# Altium footprint library ICs And Semiconductors THD.PcbLib: 507 footprints (part 13 of 32) (continued)
## GVA_IPSS-DU [mm] "Decoupling Unit (DU) Using Toroidal-Core Transformer, Body 49.5mm x 49.5mm"
height 27
pads (11):
  round 1.7 hole 1: +1(14.87,-20) +2(17.41,-20) +3(19.95,-20) -1(-20.05,-20) -2(-17.51,-20) -3(-14.97,-20) NC1(-20.05,20) NC2(-17.51,20) NC3(17.41,20) NC4(19.95,20)
  round 1 hole 40 unplated mask+19.5: MECH(0,0)
Top Overlay:
  lines w0.2: -18.51,-22.9 -17.51,-22.9 -16.51,-22.9 ; 16.41,-22.9 17.41,-22.9 ; 17.41,-23.9 17.41,-22.9 ; 17.41,-21.9 17.41,-22.9 ; 18.41,-22.9 17.41,-22.9 ; -24.75,-20.75 ccw(c-20.75,-20.75) -20.75,-24.75 20.75,-24.75 ccw(c20.75,-20.75) 24.75,-20.75 24.75,20.75 ccw(c20.75,20.75) 20.75,24.75 -20.75,24.75 ccw(c-20.75,20.75) -24.75,20.75 -24.75,-20.75
Notvisible:
  lines w0.1: -20.55,-20 -20.05,-20 ; -20.55,20 -20.05,20 ; -20.05,-20.5 -20.05,-20 ; -20.05,-19.5 -20.05,-20 ; -20.05,19.5 -20.05,20 ; -20.05,20.5 -20.05,20 ; -19.55,-20 -20.05,-20 ; -19.55,20 -20.05,20 ; -18.01,-20 -17.51,-20 ; -18.01,20 -17.51,20 ; -17.51,-20.5 -17.51,-20 ; -17.51,-19.5 -17.51,-20 ; -17.51,19.5 -17.51,20 ; -17.51,20.5 -17.51,20 ; -17.01,-20 -17.51,-20 ; -17.01,20 -17.51,20 ; -15.47,-20 -14.97,-20 ; -14.97,-20.5 -14.97,-20 ; -14.97,-19.5 -14.97,-20 ; -14.47,-20 -14.97,-20 ; -0.5,0 0,0 ; 0,-0.5 0,0 ; 0,0.5 0,0 ; 0.5,0 0,0 ; 14.37,-20 14.87,-20 ; 14.87,-20.5 14.87,-20 ; 14.87,-19.5 14.87,-20 ; 15.37,-20 14.87,-20 ; 16.91,-20 17.41,-20 ; 16.91,20 17.41,20 ; 17.41,-20.5 17.41,-20 ; 17.41,-19.5 17.41,-20 ; 17.41,19.5 17.41,20 ; 17.41,20.5 17.41,20 ; 17.91,-20 17.41,-20 ; 17.91,20 17.41,20 ; 19.45,-20 19.95,-20 ; 19.45,20 19.95,20 ; 19.95,-20.5 19.95,-20 ; 19.95,-19.5 19.95,-20 ; 19.95,19.5 19.95,20 ; 19.95,20.5 19.95,20 ; 20.45,-20 19.95,-20 ; 20.45,20 19.95,20
Mechanical 14:
  circle w0.1: c0,0 r9.9
  circle w0.1: c0,0 r5
  lines w0.1: -18.51,-22.9 -17.51,-22.9 -16.51,-22.9 ; 16.41,-22.9 17.41,-22.9 ; 17.41,-23.9 17.41,-22.9 ; 17.41,-21.9 17.41,-22.9 ; 18.41,-22.9 17.41,-22.9 ; -24.75,-20.75 ccw(c-20.75,-20.75) -20.75,-24.75 20.75,-24.75 ccw(c20.75,-20.75) 24.75,-20.75 24.75,20.75 ccw(c20.75,20.75) 20.75,24.75 -20.75,24.75 ccw(c-20.75,20.75) -24.75,20.75 -24.75,-20.75
3D body "GVA_IPSS-DU.stp": height 27, standoff -3.8, extent -24.75,-24.75 24.75,24.75

## HAMAMATSU_H7546B [mm] "MAPMT 8×8 Multianode, High Speed Response, Low Cross-talk, 30 mm2, Body 30.5 x 30.5 x 47.6mm"
height 47.6
pads (73):
  round 1.6 hole 0.9: 1(8.89,8.89) 2(8.89,6.35) 3(8.89,3.81) 4(8.89,1.27) 5(8.89,-1.27) 6(8.89,-3.81) 7(8.89,-6.35) 8(8.89,-8.89) 9(6.35,8.89) 10(6.35,6.35) 11(6.35,3.81) 12(6.35,1.27) 13(6.35,-1.27) 14(6.35,-3.81) 15(6.35,-6.35) 16(6.35,-8.89) 17(3.81,8.89) 18(3.81,6.35) 19(3.81,3.81) 20(3.81,1.27) 21(3.81,-1.27) 22(3.81,-3.81) 23(3.81,-6.35) 24(3.81,-8.89) 25(1.27,8.89) 26(1.27,6.35) 27(1.27,3.81) 28(1.27,1.27) 29(1.27,-1.27) 30(1.27,-3.81) 31(1.27,-6.35) 32(1.27,-8.89) 33(-1.27,8.89) 34(-1.27,6.35) 35(-1.27,3.81) 36(-1.27,1.27) 37(-1.27,-1.27) 38(-1.27,-3.81) 39(-1.27,-6.35) 40(-1.27,-8.89) 41(-3.81,8.89) 42(-3.81,6.35) 43(-3.81,3.81) 44(-3.81,1.27) 45(-3.81,-1.27) 46(-3.81,-3.81) 47(-3.81,-6.35) 48(-3.81,-8.89) 49(-6.35,8.89) 50(-6.35,6.35) 51(-6.35,3.81) 52(-6.35,1.27) 53(-6.35,-1.27) 54(-6.35,-3.81) 55(-6.35,-6.35) 56(-6.35,-8.89) 57(-8.89,8.89) 58(-8.89,6.35) 59(-8.89,3.81) 60(-8.89,1.27) 61(-8.89,-1.27) 62(-8.89,-3.81) 63(-8.89,-6.35) 64(-8.89,-8.89)
  round 1.6 hole 0.9 paste+0: 65(11.43,6.35) 66(11.43,3.81) 67(11.43,1.27) 68(-11.43,6.35) 69(-11.43,-6.35)
  round 1 hole 5 unplated mask+2: MEC(-11.43,-11.43) MEC(-11.43,11.43) MEC(11.43,-11.43) MEC(11.43,11.43)
Top Overlay:
  lines w0.2: -14.25,-10.43 -14.25,10.43 ; -12.85,-8.372 -12.85,8.372 ; -10.43,-14.25 10.43,-14.25 ; -10.43,14.25 10.43,14.25 ; -8.372,-12.85 8.372,-12.85 ; -8.372,12.85 8.372,12.85 ; 12.85,-8.372 12.85,8.372 ; 14.25,-10.43 14.25,10.43 ; -15.25,-15.25 -15.25,15.25 15.25,15.25 15.25,-15.25 -15.25,-15.25
  text "57" at -8,10.33 h1.2
  text "64" at -8,-11.6 h1.2
  text "8" at 7.05,-11.5 h1.2
  text "1" at 6.85,10.33 h1.2
Notvisible:
  drawing of 300 lines, arcs and shapes, not listed
Mechanical 14:
  drawing of 276 lines, arcs and shapes, not listed
  text "57" at -8,10.33 h1.2
  text "64" at -8,-11.6 h1.2
  text "8" at 7.05,-11.5 h1.2
  text "1" at 6.85,10.33 h1.2
3D body "HAMAMATSU_H7546B_part1.stp": height 47.6, standoff -3.6, extent -15.25,-15.25 15.25,15.25
3D body "HAMAMATSU_H7546B_part2.stp": height 46.8, standoff 46.3, extent -11.85,-11.85 11.85,11.85

## HAMAMATSU_S11105 [mm] "22 Leads Dual In-Line Package, Row Spacing 10.16mm; Pitch 2.54mm"
height 4
pads (22):
  rect 1.6x1.6 hole 0.9: 1(-5.08,12.7)
  round 1.6 hole 0.9: 2(-5.08,10.16) 3(-5.08,7.62) 4(-5.08,5.08) 5(-5.08,2.54) 6(-5.08,0) 7(-5.08,-2.54) 8(-5.08,-5.08) 9(-5.08,-7.62) 10(-5.08,-10.16) 11(-5.08,-12.7) 12(5.08,-12.7) 13(5.08,-10.16) 14(5.08,-7.62) 15(5.08,-5.08) 16(5.08,-2.54) 17(5.08,0) 18(5.08,2.54) 19(5.08,5.08) 20(5.08,7.62) 21(5.08,10.16) 22(5.08,12.7)
Top Overlay:
  lines w0.2: -5,-13.797 -5,-15.875 5,-15.875 5,-13.797 ; -5,13.797 -5,15.875 5,15.875 5,13.797 ; -4.046,-7.995 ccw(c-4,-7.8) -4,-8 4,-8 ccw(c4,-7.8) 4.046,-7.995 ; -4.046,7.995 cw(c-4,7.8) -4,8 4,8 cw(c4,7.8) 4.046,7.995 ; -3.55,13.2 -1.95,14.8 -3.55,14.8 -3.55,13.2 ; -3,-5.3 ccw(c-2.8,-5.3) -2.8,-5.5 2.8,-5.5 ccw(c2.8,-5.3) 3,-5.3 3,5.3 ccw(c2.8,5.3) 2.8,5.5 -2.8,5.5 ccw(c-2.8,5.3) -3,5.3 -3,-5.3 ; -2.5,-4.3 ccw(c-2.3,-4.3) -2.3,-4.5 2,-4.5 ccw(c2,-4.3) 2.2,-4.3 2.2,4.3 ccw(c2,4.3) 2,4.5 -2.3,4.5 ccw(c-2.3,4.3) -2.5,4.3 -2.5,-4.3 ; -1.05,-4 1.75,-4 1.75,4 -1.05,4 -1.05,-4 ; -0.25,-2.8 0.25,-2.8 0.25,3.6 -0.25,3.6 -0.25,-2.8
Notvisible:
  lines w0.1: -5.58,-12.7 -5.08,-12.7 ; -5.58,-10.16 -5.08,-10.16 ; -5.58,-7.62 -5.08,-7.62 ; -5.58,-5.08 -5.08,-5.08 ; -5.58,-2.54 -5.08,-2.54 ; -5.58,0 -5.08,0 ; -5.58,2.54 -5.08,2.54 ; -5.58,5.08 -5.08,5.08 ; -5.58,7.62 -5.08,7.62 ; -5.58,10.16 -5.08,10.16 ; -5.58,12.7 -5.08,12.7 ; -5.08,-13.2 -5.08,-12.7 ; -5.08,-12.2 -5.08,-12.7 ; -5.08,-10.66 -5.08,-10.16 ; -5.08,-9.66 -5.08,-10.16 ; -5.08,-8.12 -5.08,-7.62 ; -5.08,-7.12 -5.08,-7.62 ; -5.08,-5.58 -5.08,-5.08 ; -5.08,-4.58 -5.08,-5.08 ; -5.08,-3.04 -5.08,-2.54 ; -5.08,-2.04 -5.08,-2.54 ; -5.08,-0.5 -5.08,0 ; -5.08,0.5 -5.08,0 ; -5.08,2.04 -5.08,2.54 ; -5.08,3.04 -5.08,2.54 ; -5.08,4.58 -5.08,5.08 ; -5.08,5.58 -5.08,5.08 ; -5.08,7.12 -5.08,7.62 ; -5.08,8.12 -5.08,7.62 ; -5.08,9.66 -5.08,10.16 ; -5.08,10.66 -5.08,10.16 ; -5.08,12.2 -5.08,12.7 ; -5.08,13.2 -5.08,12.7 ; -4.58,-12.7 -5.08,-12.7 ; -4.58,-10.16 -5.08,-10.16 ; -4.58,-7.62 -5.08,-7.62 ; -4.58,-5.08 -5.08,-5.08 ; -4.58,-2.54 -5.08,-2.54 ; -4.58,0 -5.08,0 ; -4.58,2.54 -5.08,2.54 ; -4.58,5.08 -5.08,5.08 ; -4.58,7.62 -5.08,7.62 ; -4.58,10.16 -5.08,10.16 ; -4.58,12.7 -5.08,12.7 ; -0.5,0 0,0 ; 0,-0.5 0,0 ; 0,0.5 0,0 ; 0.5,0 0,0 ; 4.58,-12.7 5.08,-12.7 ; 4.58,-10.16 5.08,-10.16 ; 4.58,-7.62 5.08,-7.62 ; 4.58,-5.08 5.08,-5.08 ; 4.58,-2.54 5.08,-2.54 ; 4.58,0 5.08,0 ; 4.58,2.54 5.08,2.54 ; 4.58,5.08 5.08,5.08 ; 4.58,7.62 5.08,7.62 ; 4.58,10.16 5.08,10.16 ; 4.58,12.7 5.08,12.7 ; 5.08,-13.2 5.08,-12.7 ; 5.08,-12.2 5.08,-12.7 ; 5.08,-10.66 5.08,-10.16 ; 5.08,-9.66 5.08,-10.16 ; 5.08,-8.12 5.08,-7.62 ; 5.08,-7.12 5.08,-7.62 ; 5.08,-5.58 5.08,-5.08 ; 5.08,-4.58 5.08,-5.08 ; 5.08,-3.04 5.08,-2.54 ; 5.08,-2.04 5.08,-2.54 ; 5.08,-0.5 5.08,0 ; 5.08,0.5 5.08,0 ; 5.08,2.04 5.08,2.54 ; 5.08,3.04 5.08,2.54 ; 5.08,4.58 5.08,5.08 ; 5.08,5.58 5.08,5.08 ; 5.08,7.12 5.08,7.62 ; 5.08,8.12 5.08,7.62 ; 5.08,9.66 5.08,10.16 ; 5.08,10.66 5.08,10.16 ; 5.08,12.2 5.08,12.7 ; 5.08,13.2 5.08,12.7 ; 5.58,-12.7 5.08,-12.7 ; 5.58,-10.16 5.08,-10.16 ; 5.58,-7.62 5.08,-7.62 ; 5.58,-5.08 5.08,-5.08 ; 5.58,-2.54 5.08,-2.54 ; 5.58,0 5.08,0 ; 5.58,2.54 5.08,2.54 ; 5.58,5.08 5.08,5.08 ; 5.58,7.62 5.08,7.62 ; 5.58,10.16 5.08,10.16 ; 5.58,12.7 5.08,12.7
Mechanical 14:
  lines w0.1: -5,-15.875 -5,15.875 5,15.875 5,-15.875 -5,-15.875 ; -4.4,13.575 -4.4,15.175 -2.8,15.175 -4.4,13.575 ; -4.2,-7.8 ccw(c-4,-7.8) -4,-8 4,-8 ccw(c4,-7.8) 4.2,-7.8 4.2,7.8 ccw(c4,7.8) 4,8 -4,8 ccw(c-4,7.8) -4.2,7.8 -4.2,-7.8 ; -3,-5.3 ccw(c-2.8,-5.3) -2.8,-5.5 2.8,-5.5 ccw(c2.8,-5.3) 3,-5.3 3,5.3 ccw(c2.8,5.3) 2.8,5.5 -2.8,5.5 ccw(c-2.8,5.3) -3,5.3 -3,-5.3 ; -2.5,-4.3 ccw(c-2.3,-4.3) -2.3,-4.5 2,-4.5 ccw(c2,-4.3) 2.2,-4.3 2.2,4.3 ccw(c2,4.3) 2,4.5 -2.3,4.5 ccw(c-2.3,4.3) -2.5,4.3 -2.5,-4.3 ; -1.05,-4 1.75,-4 1.75,4 -1.05,4 -1.05,-4 ; -0.25,-2.8 0.25,-2.8 0.25,3.6 -0.25,3.6 -0.25,-2.8
3D body "HAMAMATSU_S11105.stp": height 3, standoff -4.3, extent -5.205,-15.875 5.205,15.875

## HAMAMATSU_S12572-010C [mm] "3x3mm Single Element MPPC (Multi-Pixel Photon Counter)"
height 4
pads (2):
  round 1.4 hole 0.7: 1(2,-1.27) 2(2,1.27)
Top Overlay:
  lines w0.2: 0.924,-1.5 -1.83,-1.5 -1.83,1.5 0.924,1.5 ; 0.988,-1.7 -2.03,-1.7 -2.03,1.7 0.988,1.7 ; 1.17,-0.548 1.17,0.548 ; 1.37,-0.368 1.37,0.368 ; 2.115,-2.45 2.115,-2.364 ; 2.115,-0.176 2.115,0.176 ; 2.115,2.364 2.115,2.45 ; 2.775,-2.051 2.775,-2.45 -2.775,-2.45 -2.775,2.45 2.775,2.45 2.775,2.051 ; 2.775,-0.489 2.775,0.489 ; -3.35,-3.025 3.35,-3.025 3.35,3.025 -3.35,3.025 -3.35,-3.025
  text "A" at 3.9,-1.8 h1.2
  text "C" at 3.9,0.7 h1.2
Notvisible:
  lines w0.1: -0.5,0 0,0 ; 0,-0.5 0,0 ; 0,0.5 0,0 ; 0.5,0 0,0 ; 1.5,-1.27 2,-1.27 ; 1.5,1.27 2,1.27 ; 2,-1.77 2,-1.27 ; 2,-0.77 2,-1.27 ; 2,0.77 2,1.27 ; 2,1.77 2,1.27 ; 2.5,-1.27 2,-1.27 ; 2.5,1.27 2,1.27
Mechanical 14:
  lines w0.1: 2.115,-2.45 2.115,2.45 ; -3.35,-3.025 3.35,-3.025 3.35,3.025 -3.35,3.025 -3.35,-3.025 ; -2.775,-2.45 -2.775,2.45 2.775,2.45 2.775,-2.45 -2.775,-2.45 ; -2.03,-1.7 -2.03,1.7 1.37,1.7 1.37,-1.7 -2.03,-1.7 ; -1.83,-1.5 -1.83,1.5 1.17,1.5 1.17,-1.5 -1.83,-1.5
3D body "HAMAMATSU_S12572-010C.stp": height 2.2, standoff -3.6, extent -3.275,-2.95 3.275,2.95

## HEIMANN_HVS VAC 03G [mm] "TO-8 12 Leads, Body Dia. 15.35mm, Lead Diameter 0.45mm"
height 6.9
pads (12):
  round 1.5 hole 0.8: 1(2.54,-5.08) 2(0,-5.08) 3(-2.54,-5.08) 4(-5.08,-2.54) 5(-5.08,0) 6(-5.08,2.54) 7(-2.54,5.08) 8(0,5.08) 9(2.54,5.08) 10(5.08,2.54) 11(5.08,0) 12(5.08,-2.54)
Top Overlay:
  circle w0.2: c0,0.003 r6.975
  circle w0.2: c0,0.003 r7.675
  lines w0.2: 5.137,-5.703 5.71,-6.276 6.276,-5.71 5.703,-5.137
  text "1" at 1.75,-4 h0.8
  text "12" at 2.75,-2.25 h0.8
Notvisible:
  lines w0.05: -5.58,-2.54 -5.08,-2.54 ; -5.58,0 -5.08,0 ; -5.58,2.54 -5.08,2.54 ; -5.08,-3.04 -5.08,-2.54 ; -5.08,-2.04 -5.08,-2.54 ; -5.08,-0.5 -5.08,0 ; -5.08,0.5 -5.08,0 ; -5.08,2.04 -5.08,2.54 ; -5.08,3.04 -5.08,2.54 ; -4.58,-2.54 -5.08,-2.54 ; -4.58,0 -5.08,0 ; -4.58,2.54 -5.08,2.54 ; -3.04,-5.08 -2.54,-5.08 ; -3.04,5.08 -2.54,5.08 ; -2.54,-5.58 -2.54,-5.08 ; -2.54,-4.58 -2.54,-5.08 ; -2.54,4.58 -2.54,5.08 ; -2.54,5.58 -2.54,5.08 ; -2.04,-5.08 -2.54,-5.08 ; -2.04,5.08 -2.54,5.08 ; -0.5,-5.08 0,-5.08 ; -0.5,0 0,0 ; -0.5,5.08 0,5.08 ; 0,-5.58 0,-5.08 ; 0,-4.58 0,-5.08 ; 0,-0.5 0,0 ; 0,0.5 0,0 ; 0,4.58 0,5.08 ; 0,5.58 0,5.08 ; 0.5,-5.08 0,-5.08 ; 0.5,0 0,0 ; 0.5,5.08 0,5.08 ; 2.04,-5.08 2.54,-5.08 ; 2.04,5.08 2.54,5.08 ; 2.54,-5.58 2.54,-5.08 ; 2.54,-4.58 2.54,-5.08 ; 2.54,4.58 2.54,5.08 ; 2.54,5.58 2.54,5.08 ; 3.04,-5.08 2.54,-5.08 ; 3.04,5.08 2.54,5.08 ; 4.58,-2.54 5.08,-2.54 ; 4.58,0 5.08,0 ; 4.58,2.54 5.08,2.54 ; 5.08,-3.04 5.08,-2.54 ; 5.08,-2.04 5.08,-2.54 ; 5.08,-0.5 5.08,0 ; 5.08,0.5 5.08,0 ; 5.08,2.04 5.08,2.54 ; 5.08,3.04 5.08,2.54 ; 5.58,-2.54 5.08,-2.54 ; 5.58,0 5.08,0 ; 5.58,2.54 5.08,2.54
Mechanical 14:
  circle w0.1: c0,0.003 r6.975
  circle w0.1: c0,0 r7.675
  lines w0.1: 5.137,-5.703 5.71,-6.276 6.276,-5.71 5.703,-5.137
  text "1" at 1.75,-4 h0.8
  text "12" at 2.75,-2.25 h0.8
3D body "HEIMANN_HVS VAC 03G.stp": height 6.9, standoff -3.6, extent -7.673,-7.674 7.674,7.673

## HEIMANN_HVS VAC 04(TO39) [mm] "TO-39 4 Leads, Body Dia. 9.2mm, Lead Diameter 0.45mm"
height 4
pads (4):
  round 1.5 hole 0.8: 1(-2.54,0) 2(0,-2.54) 3(2.54,0) 4(0,2.54)
Top Overlay:
  circle w0.2: c0,0 r0.5
  circle w0.2: c0,0 r4.1
  circle w0.2: c0,0 r4.6
  lines w0.2: -3.587,2.88 -4.227,3.519 -3.519,4.227 -2.88,3.587
Notvisible:
  lines w0.1: -3.04,0 -2.54,0 ; -2.54,-0.5 -2.54,0 ; -2.54,0.5 -2.54,0 ; -2.04,0 -2.54,0 ; -0.5,-2.54 0,-2.54 ; -0.5,0 0,0 ; -0.5,2.54 0,2.54 ; 0,-3.04 0,-2.54 ; 0,-2.04 0,-2.54 ; 0,-0.5 0,0 ; 0,0.5 0,0 ; 0,2.04 0,2.54 ; 0,3.04 0,2.54 ; 0.5,-2.54 0,-2.54 ; 0.5,0 0,0 ; 0.5,2.54 0,2.54 ; 2.04,0 2.54,0 ; 2.54,-0.5 2.54,0 ; 2.54,0.5 2.54,0 ; 3.04,0 2.54,0
  text "2" at -0.338,-1.815 h0.88
  text "3" at 1.22,-0.478 h0.88
  text "4" at -0.315,1.044 h0.88
  text "1" at -1.905,-0.344 h0.88
Mechanical 14:
  circle w0.1: c0,0 r0.5
  circle w0.1: c0,0 r4.1
  circle w0.1: c0,0 r4.6
  lines w0.1: -3.587,2.88 -4.227,3.519 -3.519,4.227 -2.88,3.587
3D body "HEIMANN_HVS VAC 04(TO39).stp": height 4, standoff -3.6, extent -4.6,-4.6 4.6,4.6

## HMS_AB6000 [mm] "DIL-32 Anybus®-IC™ Module for Fieldbus and Ethernet, Row Spacing 15.24mm; Pitch 2.54mm, Body 41.6 x 21.1mm"
height 14.2
pads (26):
  rect 1.6x1.6 hole 0.9: 1(-7.62,19.05)
  round 1.6 hole 0.9: 2(-7.62,16.51) 3(-7.62,13.97) 4(-7.62,11.43) 5(-7.62,8.89) 6(-7.62,6.35) 7(-7.62,3.81) 8(-7.62,1.27) 9(-7.62,-1.27) 13(-7.62,-11.43) 14(-7.62,-13.97) 15(-7.62,-16.51) 16(-7.62,-19.05) 17(7.62,-19.05) 18(7.62,-16.51) 19(7.62,-13.97) 20(7.62,-11.43) 24(7.62,-1.27) 25(7.62,1.27) 26(7.62,3.81) 27(7.62,6.35) 28(7.62,8.89) 29(7.62,11.43) 30(7.62,13.97) 31(7.62,16.51) 32(7.62,19.05)
Top Overlay:
  circle w0.3: c-10.05,19.875 r0.15
  lines w0.2: -10.55,-20.8 8.01,-20.8 10.55,-18.26 10.55,20.8 -8.01,20.8 -9.28,19.53 -10.55,18.26 -10.55,-20.8
Notvisible:
  lines w0.1: -8.12,-19.05 -7.62,-19.05 ; -8.12,-16.51 -7.62,-16.51 ; -8.12,-13.97 -7.62,-13.97 ; -8.12,-11.43 -7.62,-11.43 ; -8.12,-1.27 -7.62,-1.27 ; -8.12,1.27 -7.62,1.27 ; -8.12,3.81 -7.62,3.81 ; -8.12,6.35 -7.62,6.35 ; -8.12,8.89 -7.62,8.89 ; -8.12,11.43 -7.62,11.43 ; -8.12,13.97 -7.62,13.97 ; -8.12,16.51 -7.62,16.51 ; -8.12,19.05 -7.62,19.05 ; -7.62,-19.55 -7.62,-19.05 ; -7.62,-18.55 -7.62,-19.05 ; -7.62,-17.01 -7.62,-16.51 ; -7.62,-16.01 -7.62,-16.51 ; -7.62,-14.47 -7.62,-13.97 ; -7.62,-13.47 -7.62,-13.97 ; -7.62,-11.93 -7.62,-11.43 ; -7.62,-10.93 -7.62,-11.43 ; -7.62,-1.77 -7.62,-1.27 ; -7.62,-0.77 -7.62,-1.27 ; -7.62,0.77 -7.62,1.27 ; -7.62,1.77 -7.62,1.27 ; -7.62,3.31 -7.62,3.81 ; -7.62,4.31 -7.62,3.81 ; -7.62,5.85 -7.62,6.35 ; -7.62,6.85 -7.62,6.35 ; -7.62,8.39 -7.62,8.89 ; -7.62,9.39 -7.62,8.89 ; -7.62,10.93 -7.62,11.43 ; -7.62,11.93 -7.62,11.43 ; -7.62,13.47 -7.62,13.97 ; -7.62,14.47 -7.62,13.97 ; -7.62,16.01 -7.62,16.51 ; -7.62,17.01 -7.62,16.51 ; -7.62,18.55 -7.62,19.05 ; -7.62,19.55 -7.62,19.05 ; -7.12,-19.05 -7.62,-19.05 ; -7.12,-16.51 -7.62,-16.51 ; -7.12,-13.97 -7.62,-13.97 ; -7.12,-11.43 -7.62,-11.43 ; -7.12,-1.27 -7.62,-1.27 ; -7.12,1.27 -7.62,1.27 ; -7.12,3.81 -7.62,3.81 ; -7.12,6.35 -7.62,6.35 ; -7.12,8.89 -7.62,8.89 ; -7.12,11.43 -7.62,11.43 ; -7.12,13.97 -7.62,13.97 ; -7.12,16.51 -7.62,16.51 ; -7.12,19.05 -7.62,19.05 ; -0.5,0 0,0 ; 0,-0.5 0,0 ; 0,0.5 0,0 ; 0.5,0 0,0 ; 7.12,-19.05 7.62,-19.05 ; 7.12,-16.51 7.62,-16.51 ; 7.12,-13.97 7.62,-13.97 ; 7.12,-11.43 7.62,-11.43 ; 7.12,-1.27 7.62,-1.27 ; 7.12,1.27 7.62,1.27 ; 7.12,3.81 7.62,3.81 ; 7.12,6.35 7.62,6.35 ; 7.12,8.89 7.62,8.89 ; 7.12,11.43 7.62,11.43 ; 7.12,13.97 7.62,13.97 ; 7.12,16.51 7.62,16.51 ; 7.12,19.05 7.62,19.05 ; 7.62,-19.55 7.62,-19.05 ; 7.62,-18.55 7.62,-19.05 ; 7.62,-17.01 7.62,-16.51 ; 7.62,-16.01 7.62,-16.51 ; 7.62,-14.47 7.62,-13.97 ; 7.62,-13.47 7.62,-13.97 ; 7.62,-11.93 7.62,-11.43 ; 7.62,-10.93 7.62,-11.43 ; 7.62,-1.77 7.62,-1.27 ; 7.62,-0.77 7.62,-1.27 ; 7.62,0.77 7.62,1.27 ; 7.62,1.77 7.62,1.27 ; 7.62,3.31 7.62,3.81 ; 7.62,4.31 7.62,3.81 ; 7.62,5.85 7.62,6.35 ; 7.62,6.85 7.62,6.35 ; 7.62,8.39 7.62,8.89 ; 7.62,9.39 7.62,8.89 ; 7.62,10.93 7.62,11.43 ; 7.62,11.93 7.62,11.43 ; 7.62,13.47 7.62,13.97 ; 7.62,14.47 7.62,13.97 ; 7.62,16.01 7.62,16.51 ; 7.62,17.01 7.62,16.51 ; 7.62,18.55 7.62,19.05 ; 7.62,19.55 7.62,19.05 ; 8.12,-19.05 7.62,-19.05 ; 8.12,-16.51 7.62,-16.51 ; 8.12,-13.97 7.62,-13.97 ; 8.12,-11.43 7.62,-11.43 ; 8.12,-1.27 7.62,-1.27 ; 8.12,1.27 7.62,1.27 ; 8.12,3.81 7.62,3.81 ; 8.12,6.35 7.62,6.35 ; 8.12,8.89 7.62,8.89 ; 8.12,11.43 7.62,11.43 ; 8.12,13.97 7.62,13.97 ; 8.12,16.51 7.62,16.51 ; 8.12,19.05 7.62,19.05
Mechanical 14:
  circle w0.1: c-10.05,19.869 r0.5
  lines w0.1: -10.55,-20.8 8.01,-20.8 10.55,-18.26 10.55,20.8 -8.01,20.8 -10.55,18.26 -10.55,-20.8
3D body "HMS_AB6000_Part2.stp": height 14.2, standoff 2, extent -10.55,-20.8 10.55,20.8
3D body "HMS_AB6000_Part1.stp": height 11.28, standoff -3.81, extent -10.55,-20.8 10.55,20.8
3D body "HMS_AB6000_Part2.stp": height 14.2, standoff 6.68, extent -10.55,-20.8 10.55,20.8

## INFINEON_ECONODUAL2 [mm] "INFINEON EconoDUAL 2 Module"
height 17.5
pads (16):
  round 2.4 hole 1.7: 1(-13.33,20.95) 2(-9.52,20.95) 3(13.34,20.95) 4(17.15,20.95) 7(28.58,-20.95) 8(24.77,-20.95) 9(-5.71,-20.95) 10(-9.52,-20.95) 11(-24.76,-20.95) 12(-28.57,-20.95)
  rrect20% 12x13 hole 6.5: 5(53.8,14) 6(53.8,-14) 13(-53.8,-14) 14(-53.8,14)
  round 1 hole 12 unplated mask+5.5: MEC(-46.5,0) MEC(46.5,0)
Top Overlay:
  lines w0.2: -52.025,-7 -52.025,7 ; -47.3,-19.15 47.3,-19.15 ; -47.3,19.15 47.3,19.15 ; 52.025,-7 52.025,7 ; -61,-22.5 61,-22.5 61,-6.028 53.6,-6.028 53.6,6.028 61,6.028 61,22.5 -61,22.5 -61,6.028 -53.6,6.028 -53.6,-6.028 -61,-6.028 -61,-22.5
  text "1" at -13.6,17.6 h1.2
  text "2" at -9.8,17.6 h1.2
  text "3" at 13.034,17.6 h1.2
  text "4" at 16.8,17.6 h1.2
  text "7" at 28.3,-18.7 h1.2
  text "8" at 24.49,-18.7 h1.2
  text "9" at -5.99,-18.7 h1.2
  text "10" at -10.2,-18.6 h1.2
  text "11" at -25.44,-18.6 h1.2
  text "12" at -29.25,-18.6 h1.2
  text "13" at -50.78,-6.45 h1.2
  text "14" at -50.78,5.45 h1.2
  text "5" at 50.134,5.4 h1.2
  text "6" at 50.434,-6.7 h1.2
Notvisible:
  circle w0.1: c-13.33,20.95 r1.5
  lines w0.1: -54.3,-14 -53.8,-14 ; -54.3,14 -53.8,14 ; -53.8,-14.5 -53.8,-14 ; -53.8,-13.5 -53.8,-14 ; -53.8,13.5 -53.8,14 ; -53.8,14.5 -53.8,14 ; -53.3,-14 -53.8,-14 ; -53.3,14 -53.8,14 ; -47,0 -46.5,0 ; -46.5,-0.5 -46.5,0 ; -46.5,0.5 -46.5,0 ; -46,0 -46.5,0 ; -29.07,-20.95 -28.57,-20.95 ; -28.57,-21.45 -28.57,-20.95 ; -28.57,-20.45 -28.57,-20.95 ; -28.07,-20.95 -28.57,-20.95 ; -25.26,-20.95 -24.76,-20.95 ; -24.76,-21.45 -24.76,-20.95 ; -24.76,-20.45 -24.76,-20.95 ; -24.26,-20.95 -24.76,-20.95 ; -13.83,20.95 -13.33,20.95 ; -13.33,20.45 -13.33,20.95 ; -13.33,21.45 -13.33,20.95 ; -12.83,20.95 -13.33,20.95 ; -10.02,-20.95 -9.52,-20.95 ; -10.02,20.95 -9.52,20.95 ; -9.52,-21.45 -9.52,-20.95 ; -9.52,-20.45 -9.52,-20.95 ; -9.52,20.45 -9.52,20.95 ; -9.52,21.45 -9.52,20.95 ; -9.02,-20.95 -9.52,-20.95 ; -9.02,20.95 -9.52,20.95 ; -6.21,-20.95 -5.71,-20.95 ; -5.71,-21.45 -5.71,-20.95 ; -5.71,-20.45 -5.71,-20.95 ; -5.21,-20.95 -5.71,-20.95 ; -0.5,0 0,0 ; 0,-0.5 0,0 ; 0,0.5 0,0 ; 0.5,0 0,0 ; 12.84,20.95 13.34,20.95 ; 13.34,20.45 13.34,20.95 ; 13.34,21.45 13.34,20.95 ; 13.84,20.95 13.34,20.95 ; 16.65,20.95 17.15,20.95 ; 17.15,20.45 17.15,20.95 ; 17.15,21.45 17.15,20.95 ; 17.65,20.95 17.15,20.95 ; 24.27,-20.95 24.77,-20.95 ; 24.77,-21.45 24.77,-20.95 ; 24.77,-20.45 24.77,-20.95 ; 25.27,-20.95 24.77,-20.95 ; 28.08,-20.95 28.58,-20.95 ; 28.58,-21.45 28.58,-20.95 ; 28.58,-20.45 28.58,-20.95 ; 29.08,-20.95 28.58,-20.95 ; 46,0 46.5,0 ; 46.5,-0.5 46.5,0 ; 46.5,0.5 46.5,0 ; 47,0 46.5,0 ; 53.3,-14 53.8,-14 ; 53.3,14 53.8,14 ; 53.8,-14.5 53.8,-14 ; 53.8,-13.5 53.8,-14 ; 53.8,13.5 53.8,14 ; 53.8,14.5 53.8,14 ; 54.3,-14 53.8,-14 ; 54.3,14 53.8,14 ; -59.8,-19.3 -59.8,-8.7 -58.6,-7.5 -49,-7.5 -47.8,-8.7 -47.8,-19.3 -49,-20.5 -58.6,-20.5 -59.8,-19.3 ; -59.8,8.7 -58.6,7.5 -49,7.5 -47.8,8.7 -47.8,19.3 -49,20.5 -58.6,20.5 -59.8,19.3 -59.8,8.7 ; 47.8,-19.3 49,-20.5 58.6,-20.5 59.8,-19.3 59.8,-8.7 58.6,-7.5 49,-7.5 47.8,-8.7 47.8,-19.3 ; 47.8,8.7 49,7.5 58.6,7.5 59.8,8.7 59.8,19.3 58.6,20.5 49,20.5 47.8,19.3 47.8,8.7
Mechanical 14:
  lines w0.1: -55.1,-22.5 -55.1,-6.028 ; -55.1,6.028 -55.1,22.5 ; -53.6,-22.5 -53.6,22.5 ; -53.6,-6.028 -61,-6.028 -61,-22.5 61,-22.5 61,-6.028 53.6,-6.028 ; -53.6,6.028 -61,6.028 -61,22.5 61,22.5 61,6.028 53.6,6.028 ; 53.6,-22.5 53.6,22.5 ; 55.1,-22.5 55.1,-6.028 ; 55.1,6.028 55.1,22.5 ; -52.4,-19.15 -52.4,19.15 52.4,19.15 52.4,-19.15 -52.4,-19.15
  text "1" at -13.6,17.6 h1.2
  text "2" at -9.8,17.6 h1.2
  text "3" at 13.034,17.6 h1.2
  text "4" at 16.8,17.6 h1.2
  text "7" at 28.3,-18.7 h1.2
  text "8" at 24.49,-18.7 h1.2
  text "9" at -5.99,-18.7 h1.2
  text "10" at -10.2,-18.6 h1.2
  text "11" at -25.44,-18.6 h1.2
  text "12" at -29.25,-18.6 h1.2
  text "13" at -50.78,-6.45 h1.2
  text "14" at -50.78,5.45 h1.2
  text "5" at 50.134,5.4 h1.2
  text "6" at 50.434,-6.7 h1.2
3D body "INFINEON_ECONODUAL2.stp": height 17, standoff -3.5, extent -61,-22.5 61,22.5

## INFINEON_ECONODUAL2_a [mm] "INFINEON EconoDUAL 2 Module"
height 17.5
pads (10):
  round 2.4 hole 1.7: 1(-13.33,20.95) 2(-9.52,20.95) 3(13.34,20.95) 4(17.15,20.95) 7(28.58,-20.95) 8(24.77,-20.95) 9(-5.71,-20.95) 10(-9.52,-20.95) 11(-24.76,-20.95) 12(-28.57,-20.95)
Top Overlay:
  lines w0.2: -52.025,-7 -52.025,7 ; -47.3,-19.15 47.3,-19.15 ; -47.3,19.15 47.3,19.15 ; 52.025,-7 52.025,7 ; -61,-22.5 61,-22.5 61,-6.028 53.6,-6.028 53.6,6.028 61,6.028 61,22.5 -61,22.5 -61,6.028 -53.6,6.028 -53.6,-6.028 -61,-6.028 -61,-22.5
  text "1" at -13.6,17.6 h1.2
  text "2" at -9.8,17.6 h1.2
  text "3" at 13.034,17.6 h1.2
  text "4" at 16.8,17.6 h1.2
  text "7" at 28.3,-18.7 h1.2
  text "8" at 24.49,-18.7 h1.2
  text "9" at -5.99,-18.7 h1.2
  text "10" at -10.2,-18.6 h1.2
  text "11" at -25.44,-18.6 h1.2
  text "12" at -29.25,-18.6 h1.2
  text "13" at -50.78,-6.45 h1.2
  text "14" at -50.78,5.45 h1.2
  text "5" at 50.134,5.4 h1.2
  text "6" at 50.434,-6.7 h1.2
Notvisible:
  circle w0.1: c-13.33,20.95 r1.5
  lines w0.1: -54.3,-14 -53.8,-14 ; -54.3,14 -53.8,14 ; -53.8,-14.5 -53.8,-14 ; -53.8,-13.5 -53.8,-14 ; -53.8,13.5 -53.8,14 ; -53.8,14.5 -53.8,14 ; -53.3,-14 -53.8,-14 ; -53.3,14 -53.8,14 ; -47,0 -46.5,0 ; -46.5,-0.5 -46.5,0 ; -46.5,0.5 -46.5,0 ; -46,0 -46.5,0 ; -29.07,-20.95 -28.57,-20.95 ; -28.57,-21.45 -28.57,-20.95 ; -28.57,-20.45 -28.57,-20.95 ; -28.07,-20.95 -28.57,-20.95 ; -25.26,-20.95 -24.76,-20.95 ; -24.76,-21.45 -24.76,-20.95 ; -24.76,-20.45 -24.76,-20.95 ; -24.26,-20.95 -24.76,-20.95 ; -13.83,20.95 -13.33,20.95 ; -13.33,20.45 -13.33,20.95 ; -13.33,21.45 -13.33,20.95 ; -12.83,20.95 -13.33,20.95 ; -10.02,-20.95 -9.52,-20.95 ; -10.02,20.95 -9.52,20.95 ; -9.52,-21.45 -9.52,-20.95 ; -9.52,-20.45 -9.52,-20.95 ; -9.52,20.45 -9.52,20.95 ; -9.52,21.45 -9.52,20.95 ; -9.02,-20.95 -9.52,-20.95 ; -9.02,20.95 -9.52,20.95 ; -6.21,-20.95 -5.71,-20.95 ; -5.71,-21.45 -5.71,-20.95 ; -5.71,-20.45 -5.71,-20.95 ; -5.21,-20.95 -5.71,-20.95 ; -0.5,0 0,0 ; 0,-0.5 0,0 ; 0,0.5 0,0 ; 0.5,0 0,0 ; 12.84,20.95 13.34,20.95 ; 13.34,20.45 13.34,20.95 ; 13.34,21.45 13.34,20.95 ; 13.84,20.95 13.34,20.95 ; 16.65,20.95 17.15,20.95 ; 17.15,20.45 17.15,20.95 ; 17.15,21.45 17.15,20.95 ; 17.65,20.95 17.15,20.95 ; 24.27,-20.95 24.77,-20.95 ; 24.77,-21.45 24.77,-20.95 ; 24.77,-20.45 24.77,-20.95 ; 25.27,-20.95 24.77,-20.95 ; 28.08,-20.95 28.58,-20.95 ; 28.58,-21.45 28.58,-20.95 ; 28.58,-20.45 28.58,-20.95 ; 29.08,-20.95 28.58,-20.95 ; 46,0 46.5,0 ; 46.5,-0.5 46.5,0 ; 46.5,0.5 46.5,0 ; 47,0 46.5,0 ; 53.3,-14 53.8,-14 ; 53.3,14 53.8,14 ; 53.8,-14.5 53.8,-14 ; 53.8,-13.5 53.8,-14 ; 53.8,13.5 53.8,14 ; 53.8,14.5 53.8,14 ; 54.3,-14 53.8,-14 ; 54.3,14 53.8,14 ; -59.8,-19.3 -59.8,-8.7 -58.6,-7.5 -49,-7.5 -47.8,-8.7 -47.8,-19.3 -49,-20.5 -58.6,-20.5 -59.8,-19.3 ; -59.8,8.7 -58.6,7.5 -49,7.5 -47.8,8.7 -47.8,19.3 -49,20.5 -58.6,20.5 -59.8,19.3 -59.8,8.7 ; 47.8,-19.3 49,-20.5 58.6,-20.5 59.8,-19.3 59.8,-8.7 58.6,-7.5 49,-7.5 47.8,-8.7 47.8,-19.3 ; 47.8,8.7 49,7.5 58.6,7.5 59.8,8.7 59.8,19.3 58.6,20.5 49,20.5 47.8,19.3 47.8,8.7
Mechanical 14:
  lines w0.1: -55.1,-22.5 -55.1,-6.028 ; -55.1,6.028 -55.1,22.5 ; -53.6,-22.5 -53.6,22.5 ; -53.6,-6.028 -61,-6.028 -61,-22.5 61,-22.5 61,-6.028 53.6,-6.028 ; -53.6,6.028 -61,6.028 -61,22.5 61,22.5 61,6.028 53.6,6.028 ; 53.6,-22.5 53.6,22.5 ; 55.1,-22.5 55.1,-6.028 ; 55.1,6.028 55.1,22.5 ; -52.4,-19.15 -52.4,19.15 52.4,19.15 52.4,-19.15 -52.4,-19.15
  text "1" at -13.6,17.6 h1.2
  text "2" at -9.8,17.6 h1.2
  text "3" at 13.034,17.6 h1.2
  text "4" at 16.8,17.6 h1.2
  text "7" at 28.3,-18.7 h1.2
  text "8" at 24.49,-18.7 h1.2
  text "9" at -5.99,-18.7 h1.2
  text "10" at -10.2,-18.6 h1.2
  text "11" at -25.44,-18.6 h1.2
  text "12" at -29.25,-18.6 h1.2
  text "13" at -50.78,-6.45 h1.2
  text "14" at -50.78,5.45 h1.2
  text "5" at 50.134,5.4 h1.2
  text "6" at 50.434,-6.7 h1.2
3D body "INFINEON_ECONODUAL2.stp": height 17, standoff -3.5, extent -61,-22.5 61,22.5

## INFINEON_PG-TO-220 FP-H [mm] "TO-220 3-Terminal Outline/Fully Isolated package (2500VAC; 1minute) - Horizontal Mount"
height 4.83
pads (4):
  rrect50% 1.6x2 hole 1.1: 1(-2.54,0)
  oval 1.6x2 hole 1.1: 2(0,0) 3(2.54,0)
  round 5.75 hole 3.5: 4(0,16.828)
Top Overlay:
  circle w0.2: c-3.5,18.9 r0.8
  circle w0.2: c3.5,18.9 r0.8
  lines w0.2: -5.08,13.407 5.08,13.407 ; -5.08,14.172 -1.827,14.172 ; -3.205,1.6 -3.205,4.43 ; -1.875,1.6 -1.875,4.43 ; -0.665,1.4 -0.665,4.43 ; 0.665,1.4 0.665,4.43 ; 1.827,14.172 5.08,14.172 ; 1.875,1.4 1.875,4.43 ; 3.205,1.4 3.205,4.43 ; -5.08,4.43 5.08,4.43 5.08,20.58 -5.08,20.58 -5.08,4.43
Notvisible:
  lines w0.1: -3.04,0 -2.54,0 ; -2.54,-0.5 -2.54,0 ; -2.54,0.5 -2.54,0 ; -2.04,0 -2.54,0 ; -0.5,0 0,0 ; 0,-0.5 0,0 ; 0,0.5 0,0 ; 0.5,0 0,0 ; 2.04,0 2.54,0 ; 2.54,-0.5 2.54,0 ; 2.54,0.5 2.54,0 ; 3.04,0 2.54,0
Mechanical 14:
  circle w0.1: c0,16.83 r1.6
  circle w0.1: c-3.5,18.9 r0.8
  circle w0.1: c3.5,18.9 r0.8
  circle w0.1: c0,16.828 r2
  lines w0.1: -5.08,13.407 5.08,13.407 ; -5.08,14.172 -1.827,14.172 ; -3.205,4.43 -3.205,1.22 -2.965,0.98 -2.965,-0.315 -2.115,-0.315 -2.115,0.98 -1.875,1.22 -1.875,4.43 ; -0.665,4.43 -0.665,1.22 -0.425,0.98 -0.425,-0.315 0.425,-0.315 0.425,0.98 0.665,1.22 0.665,4.43 ; 1.827,14.172 5.08,14.172 ; 1.875,4.43 1.875,1.22 2.115,0.98 2.115,-0.315 2.965,-0.315 2.965,0.98 3.205,1.22 3.205,4.43 ; -5.08,4.43 5.08,4.43 5.08,20.58 -5.08,20.58 -5.08,4.43
3D body "INFINEON_PG-TO-220 FP-H.stp": height 4.85, standoff -3.6, extent -5.08,-0.315 5.08,20.58

## INFINEON_PG-TO-220 FP-V [mm] "TO-220 3-Terminal Outline/Fully Isolated package (2500VAC; 1minute) - Vertical Mount"
height 19.6
pads (3):
  rrect50% 1.6x2 hole 1.1: 1(-2.54,0)
  oval 1.6x2 hole 1.1: 2(0,0) 3(2.54,0)
Top Overlay:
  lines w0.2: -5.08,0.13 -3.934,0.13 ; 3.934,0.13 5.08,0.13 ; -5.08,2.98 5.08,2.98 5.08,-1.42 4.63,-1.87 -4.63,-1.87 -5.073,-1.426 -5.08,2.98
Notvisible:
  lines w0.1: -3.04,0 -2.54,0 ; -2.54,-0.5 -2.54,0 ; -2.54,0.5 -2.54,0 ; -2.04,0 -2.54,0 ; -0.5,0 0,0 ; 0,-0.5 0,0 ; 0,0.5 0,0 ; 0.5,0 0,0 ; 2.04,0 2.54,0 ; 2.54,-0.5 2.54,0 ; 2.54,0.5 2.54,0 ; 3.04,0 2.54,0
Mechanical 14:
  lines w0.1: -5.08,0.13 5.08,0.13 ; -5.08,2.98 5.08,2.98 5.08,-1.42 4.63,-1.87 -4.63,-1.87 -5.073,-1.426 -5.08,2.98
3D body "INFINEON_PG-TO-220 FP-V.stp": height 20.7, standoff -3.6, extent -5.08,-1.87 5.08,2.98